# Altium footprint library Connectors_Old.PcbLib: 246 footprints (part 4 of 18)
Each footprint in its own frame and in the unit in brackets; x right, y up, seen from the top. Pads: shape width x height; smd on the part's side, far side on the other; paste and mask are expansions set on the pad; w line width, h text height; cw(c..) or ccw(c..) is an arc to the next point about the centre after c.
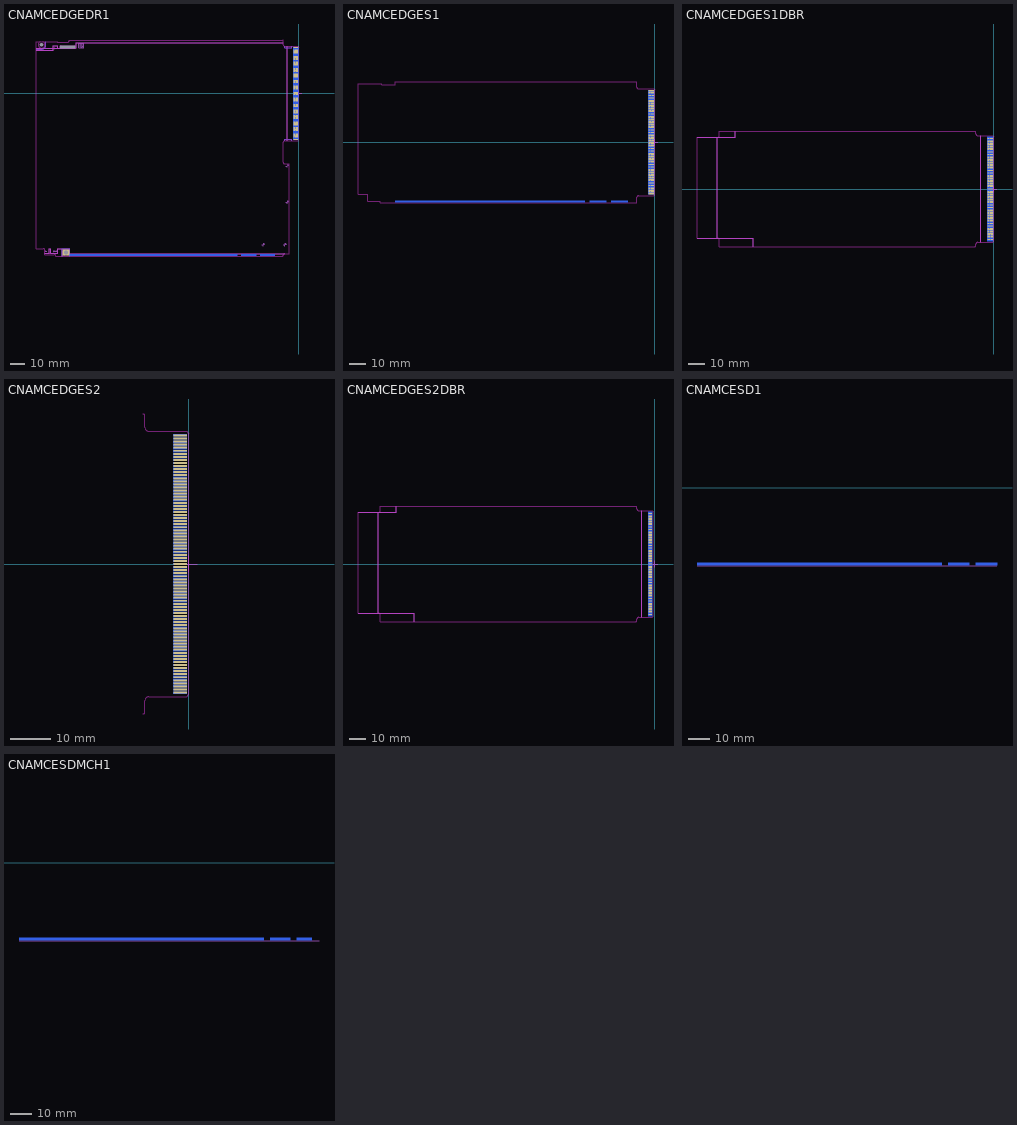
[diagram p3: the footprints below, top view; thin cyan lines are the x and y axes]

## CNAMCEDGEDR1 [mm] "AMC double edge connector standard for RTM"
pads (286):
  rect 2.2x0.48 smd paste-3: 0(-1.6,-30) 0(-1.6,30)
  rect 1.9x0.48 smd far side paste-3 mask-3: 0(-1.45,-30.75) 0(-1.45,-30) 0(-1.45,-28.5) 0(-1.45,-27.75) 0(-1.45,-26.25) 0(-1.45,-25.5) 0(-1.45,-24) 0(-1.45,-23.25) 0(-1.45,-21.75) 0(-1.45,-21) 0(-1.45,-19.5) 0(-1.45,-18.75) 0(-1.45,-17.25) 0(-1.45,-16.5) 0(-1.45,-15) 0(-1.45,-14.25) 0(-1.45,-12.75) 0(-1.45,-12) 0(-1.45,-10.5) 0(-1.45,-9.75) 0(-1.45,-8.25) 0(-1.45,-7.5) 0(-1.45,-6) 0(-1.45,-5.25) 0(-1.45,-3.75) 0(-1.45,-3) 0(-1.45,-1.5) 0(-1.45,-0.75) 0(-1.45,0.75) 0(-1.45,1.5) 0(-1.45,3) 0(-1.45,3.75) 0(-1.45,5.25) 0(-1.45,6) 0(-1.45,7.5) 0(-1.45,8.25) 0(-1.45,9.75) 0(-1.45,10.5) 0(-1.45,12) 0(-1.45,12.75) 0(-1.45,14.25) 0(-1.45,15) 0(-1.45,16.5) 0(-1.45,17.25) 0(-1.45,18.75) 0(-1.45,19.5) 0(-1.45,21) 0(-1.45,21.75) 0(-1.45,23.25) 0(-1.45,24) 0(-1.45,25.5) 0(-1.45,26.25)
  rect 1.9x0.48 smd paste-3: 0(-1.45,-28.5) 0(-1.45,-27.75) 0(-1.45,-26.25) 0(-1.45,-25.5) 0(-1.45,-24) 0(-1.45,-23.25) 0(-1.45,-19.5) 0(-1.45,-18.75) 0(-1.45,-17.25) 0(-1.45,-16.5) 0(-1.45,-15) 0(-1.45,-14.25) 0(-1.45,-12.75) 0(-1.45,-12) 0(-1.45,-8.25) 0(-1.45,-7.5) 0(-1.45,-6) 0(-1.45,-5.25) 0(-1.45,-3.75) 0(-1.45,-3) 0(-1.45,-1.5) 0(-1.45,-0.75) 0(-1.45,3) 0(-1.45,3.75) 0(-1.45,5.25) 0(-1.45,6) 0(-1.45,7.5) 0(-1.45,8.25) 0(-1.45,9.75) 0(-1.45,10.5) 0(-1.45,14.25) 0(-1.45,15) 0(-1.45,16.5) 0(-1.45,17.25) 0(-1.45,21) 0(-1.45,21.75) 0(-1.45,23.25) 0(-1.45,24)
  rect 1.15x0.48 smd paste-3: 0(-1.075,-21) 0(-1.075,-9.75) 0(-1.075,1.5) 0(-1.075,12.75) 0(-1.075,19.5) 0(-1.075,26.25) 0(-1.075,27.75) 0(-1.075,28.5)
  rect 1.15x0.48 smd far side paste-3 mask-3: 0(-1.075,27.75) 0(-1.075,28.5) 0(-1.075,29.25) 0(-1.075,30) 0(-1.075,30.75)
  oval 11x2 on Top Solder: 1(-159,31.95)
  rect 3.3x0.48 smd paste-3: 1(-2.15,31.5) 2(-2.15,30.75) 4(-2.15,29.25) 7(-2.15,27) 9(-2.15,25.5) 10(-2.15,24.75) 13(-2.15,22.5) 16(-2.15,20.25) 18(-2.15,18.75) 19(-2.15,18) 22(-2.15,15.75) 25(-2.15,13.5) 27(-2.15,12) 28(-2.15,11.25) 31(-2.15,9) 34(-2.15,6.75) 37(-2.15,4.5) 40(-2.15,2.25) 42(-2.15,0.75) 43(-2.15,0) 46(-2.15,-2.25) 49(-2.15,-4.5) 52(-2.15,-6.75) 55(-2.15,-9) 57(-2.15,-10.5) 58(-2.15,-11.25) 61(-2.15,-13.5) 64(-2.15,-15.75) 67(-2.15,-18) 70(-2.15,-20.25) 72(-2.15,-21.75) 73(-2.15,-22.5) 76(-2.15,-24.75) 79(-2.15,-27) 82(-2.15,-29.25) 84(-2.15,-30.75) 85(-2.15,-31.5)
  oval 11x2 on Bottom Solder: 2(-159,31.95)
  rect 0.9x0.48 smd paste-3: 3(-3.35,30) 83(-3.35,-30)
  rect 1.95x0.48 smd paste-3: 5(-2.825,28.5) 6(-2.825,27.75) 8(-2.825,26.25) 17(-2.825,19.5) 26(-2.825,12.75) 41(-2.825,1.5) 56(-2.825,-9.75) 71(-2.825,-21)
  rect 1.2x0.48 smd paste-3: 11(-3.2,24) 12(-3.2,23.25) 14(-3.2,21.75) 15(-3.2,21) 20(-3.2,17.25) 21(-3.2,16.5) 23(-3.2,15) 24(-3.2,14.25) 29(-3.2,10.5) 30(-3.2,9.75) 32(-3.2,8.25) 33(-3.2,7.5) 35(-3.2,6) 36(-3.2,5.25) 38(-3.2,3.75) 39(-3.2,3) 44(-3.2,-0.75) 45(-3.2,-1.5) 47(-3.2,-3) 48(-3.2,-3.75) 50(-3.2,-5.25) 51(-3.2,-6) 53(-3.2,-7.5) 54(-3.2,-8.25) 59(-3.2,-12) 60(-3.2,-12.75) 62(-3.2,-14.25) 63(-3.2,-15) 65(-3.2,-16.5) 66(-3.2,-17.25) 68(-3.2,-18.75) 69(-3.2,-19.5) 74(-3.2,-23.25) 75(-3.2,-24) 77(-3.2,-25.5) 78(-3.2,-26.25) 80(-3.2,-27.75) 81(-3.2,-28.5)
  rect 3.3x0.48 smd far side paste-3 mask-3: 86(-2.15,-31.5) 89(-2.15,-29.25) 92(-2.15,-27) 95(-2.15,-24.75) 98(-2.15,-22.5) 101(-2.15,-20.25) 104(-2.15,-18) 107(-2.15,-15.75) 110(-2.15,-13.5) 113(-2.15,-11.25) 116(-2.15,-9) 119(-2.15,-6.75) 122(-2.15,-4.5) 125(-2.15,-2.25) 128(-2.15,0) 131(-2.15,2.25) 134(-2.15,4.5) 137(-2.15,6.75) 140(-2.15,9) 143(-2.15,11.25) 146(-2.15,13.5) 149(-2.15,15.75) 152(-2.15,18) 155(-2.15,20.25) 158(-2.15,22.5) 161(-2.15,24.75) 164(-2.15,27) 170(-2.15,31.5)
  rect 1.2x0.48 smd far side paste-3 mask-3: 87(-3.2,-30.75) 88(-3.2,-30) 90(-3.2,-28.5) 91(-3.2,-27.75) 93(-3.2,-26.25) 94(-3.2,-25.5) 96(-3.2,-24) 97(-3.2,-23.25) 99(-3.2,-21.75) 100(-3.2,-21) 102(-3.2,-19.5) 103(-3.2,-18.75) 105(-3.2,-17.25) 106(-3.2,-16.5) 108(-3.2,-15) 109(-3.2,-14.25) 111(-3.2,-12.75) 112(-3.2,-12) 114(-3.2,-10.5) 115(-3.2,-9.75) 117(-3.2,-8.25) 118(-3.2,-7.5) 120(-3.2,-6) 121(-3.2,-5.25) 123(-3.2,-3.75) 124(-3.2,-3) 126(-3.2,-1.5) 127(-3.2,-0.75) 129(-3.2,0.75) 130(-3.2,1.5) 132(-3.2,3) 133(-3.2,3.75) 135(-3.2,5.25) 136(-3.2,6) 138(-3.2,7.5) 139(-3.2,8.25) 141(-3.2,9.75) 142(-3.2,10.5) 144(-3.2,12) 145(-3.2,12.75) 147(-3.2,14.25) 148(-3.2,15) 150(-3.2,16.5) 151(-3.2,17.25) 153(-3.2,18.75) 154(-3.2,19.5) 156(-3.2,21) 157(-3.2,21.75) 159(-3.2,23.25) 160(-3.2,24) 162(-3.2,25.5) 163(-3.2,26.25)
  rect 1.95x0.48 smd far side paste-3 mask-3: 165(-2.825,27.75) 166(-2.825,28.5) 167(-2.825,29.25) 168(-2.825,30) 169(-2.825,30.75)
  rect 10x1 smd far side paste-3 mask-3: EP1(-21.5,-110.95) EP1(-21.5,-110.95) EP2(-34.5,-110.95) EP2(-34.5,-110.95)
  rect 4.7x4.4 / inner round 0 / far side rect 4.7x4.4 hole 2.7 copper offset 0,0.15 paste-2.54 mask+0.254: EP3(-160,-109.4)
  rect 115.5x1 smd far side paste-3 mask-3: EP3(-100.25,-110.95) EP3(-100.25,-110.95)
  round 0 hole 2.7 unplated paste-2.54 mask+1.8: MH2(-176.85,33.5)
  round 0 hole 1.6 slot 10.6 at 0 deg unplated: MH3(-159,31.95)
Top Layer keep-out:
  lines w0.1: -180.6,30.85 -175.665,30.85 ; -174.6,-109.9 -165.8,-109.9 -165.8,-106.8 -157.4,-106.8 -157.4,-111.75 ; -173.95,33.501 -173.95,35.65 ; -9.8,-32.5 -9.8,-31.3 -5,-31.3 -5,-32.5 ; -9.8,32.5 -9.8,31.3 -5,31.3 -5,32.5
  lines w0.102: -175.665,30.851 ccw(c-176.86,33.501) -173.953,33.494
Bottom Layer keep-out:
  lines w0.1: -162.625,-111.75 -162.625,-106.8 -157.4,-106.8 -157.4,-111.75 ; -9.8,-32.5 -9.8,-31.3 -5,-31.3 -5,-32.5 ; -9.8,32.5 -9.8,31.3 -5,31.3 -5,32.5
  lines w0.102: -180.6,30.5 -176.85,30.5 ccw(c-176.85,33.5) -173.85,33.493 -173.85,35.65
Top Solder:
  rectangle: -158,35.1 -10.6,36.9
  rectangle: -157.475,-111.9 -9.8,-110.1
  rectangle: -3.9,-32.75 0.25,32.75
Bottom Solder:
  rectangle: -157.475,-111.9 -9.8,-110.1
  rectangle: -3.9,-32.75 0.25,32.75
  rectangle: -158,35.1 -10.6,36.9
Keep-Out Layer:
  lines w0.1: -168,-110.75 -174.6,-110.75 -174.6,-107.55 ccw(c-175.6,-107.55) -175.6,-106.55 -180.6,-106.55 -180.6,35.65 -166.25,35.65 ccw(c-165.384,36.15) -165.384,35.15 -159,35.15 ccw(c-159,36.15) -158,36.15 -158,36.75 -11.3,36.75 cw(c-11.3,36.25) -10.8,36.25 -10.8,33.5 ccw(c-9.8,33.5) -9.8,32.5 -0.6,32.5 0,31.9 0,-31.9 -0.6,-32.5 -9.8,-32.5 ccw(c-9.8,-33.5) -10.8,-33.5 -10.8,-47.35 ccw(c-9.8,-47.35) -9.8,-48.35 -6.7,-48.35 -6.7,-110 -9.8,-110 ccw(c-9.8,-111) -10.8,-111 -10.8,-111.25 cw(c-11.3,-111.25) -11.3,-111.75 -167,-111.75
Keep-Out Layer:
  circle w0.1: c-160,-109.4 r2.3
  lines w0.1: -177.674,35.647 ccw(c-176.85,33.5) -176.026,35.647 ; -168,-110.75 cw(c-168,-111.75) -167,-111.75 ; -163.5,30.95 cw(c-163.5,31.95) -163.5,32.95 -154,32.95 cw(c-154,31.95) -154,30.95 -163.5,30.95
Mechanical 13 keep-out:
  lines w0.1: -180.6,30.95 -153.6,30.95 -153,31.55 -153,35 -10.8,35 ; -174.6,-109.9 -171.7,-109.9 -171.7,-106.8 -170.4,-106.8 -170.4,-109.9 -165.8,-109.9 -165.8,-106.8 -157.4,-106.8 -157.4,-110 -9.8,-110 ; -7.9,-32.475 -7.9,32.525
Mechanical 14 keep-out:
  lines w0.1: -168.8,29.8 -168.8,32.975 -165.65,32.975 -165.65,30.95 -153.6,30.95 -153,31.55 -153,35 -10.8,35 ; -162.6,-111.75 -162.6,-106.8 -157.4,-106.8 -157.4,-110 -9.8,-110 ; -7.9,-32.5 -7.9,32.5
  lines w0.102: -180.6,29.8 -168.8,29.8
Mechanical 15:
  lines w0.1: -174.25,-108.325 -173.45,-108.325 -173.85,-107.925 -173.85,-108.725 ; -168.6,-107.95 -168.6,-108.75 -169,-108.35 -166.5,-108.35 -166.9,-107.95 -166.9,-108.75 ; -168.167,31 -167.367,31 -167.767,30.6 -167.767,31.4 ; -167.75,-108.75 -167.75,-107.95 ; -151.35,32.7 -147.85,32.7 -149.6,31.3 -149.6,34.1 ; -25.7,-104 -24.7,-104 -24.7,-105 ; -10.7,-104 -9.7,-104 -9.7,-105 ; -9.2,-74.85 -8.2,-74.85 -8.2,-75.85 ; -9.2,-49.85 -8.2,-49.85 -8.2,-50.85 ; -23.7,-103.6 -24.3,-103.6 -24.3,-103 -23.7,-103.6 ; -23.7,-103.6 -23.7,-103.6 ; -8.7,-103.6 -9.3,-103.6 -9.3,-103 -8.7,-103.6 ; -8.7,-103.6 -8.7,-103.6 ; -7.2,-74.45 -7.8,-73.85 -7.8,-74.45 -7.2,-74.45 ; -7.2,-74.45 -7.2,-74.45 ; -7.2,-49.45 -7.8,-49.45 -7.8,-48.85 -7.2,-49.45 ; -7.2,-49.45 -7.2,-49.45 ; -151.35,31.3 -147.85,31.3 -147.85,34.1 -151.35,34.1 -151.35,31.3
  lines w0.15: -2,0 2,0 ; 0,-2 0,2

## CNAMCEDGES1 [mm] "AMC single edge connector standard"
pads (278):
  rect 2.2x0.48 smd paste-3: 0(-1.6,-30) 0(-1.6,30)
  rect 1.9x0.48 smd far side paste-3 mask-3: 0(-1.45,-30.75) 0(-1.45,-30) 0(-1.45,-28.5) 0(-1.45,-27.75) 0(-1.45,-26.25) 0(-1.45,-25.5) 0(-1.45,-24) 0(-1.45,-23.25) 0(-1.45,-21.75) 0(-1.45,-21) 0(-1.45,-19.5) 0(-1.45,-18.75) 0(-1.45,-17.25) 0(-1.45,-16.5) 0(-1.45,-15) 0(-1.45,-14.25) 0(-1.45,-12.75) 0(-1.45,-12) 0(-1.45,-10.5) 0(-1.45,-9.75) 0(-1.45,-8.25) 0(-1.45,-7.5) 0(-1.45,-6) 0(-1.45,-5.25) 0(-1.45,-3.75) 0(-1.45,-3) 0(-1.45,-1.5) 0(-1.45,-0.75) 0(-1.45,0.75) 0(-1.45,1.5) 0(-1.45,3) 0(-1.45,3.75) 0(-1.45,5.25) 0(-1.45,6) 0(-1.45,7.5) 0(-1.45,8.25) 0(-1.45,9.75) 0(-1.45,10.5) 0(-1.45,12) 0(-1.45,12.75) 0(-1.45,14.25) 0(-1.45,15) 0(-1.45,16.5) 0(-1.45,17.25) 0(-1.45,18.75) 0(-1.45,19.5) 0(-1.45,21) 0(-1.45,21.75) 0(-1.45,23.25) 0(-1.45,24) 0(-1.45,25.5) 0(-1.45,26.25)
  rect 1.9x0.48 smd paste-3: 0(-1.45,-28.5) 0(-1.45,-27.75) 0(-1.45,-26.25) 0(-1.45,-25.5) 0(-1.45,-24) 0(-1.45,-23.25) 0(-1.45,-19.5) 0(-1.45,-18.75) 0(-1.45,-17.25) 0(-1.45,-16.5) 0(-1.45,-15) 0(-1.45,-14.25) 0(-1.45,-12.75) 0(-1.45,-12) 0(-1.45,-8.25) 0(-1.45,-7.5) 0(-1.45,-6) 0(-1.45,-5.25) 0(-1.45,-3.75) 0(-1.45,-3) 0(-1.45,-1.5) 0(-1.45,-0.75) 0(-1.45,3) 0(-1.45,3.75) 0(-1.45,5.25) 0(-1.45,6) 0(-1.45,7.5) 0(-1.45,8.25) 0(-1.45,9.75) 0(-1.45,10.5) 0(-1.45,14.25) 0(-1.45,15) 0(-1.45,16.5) 0(-1.45,17.25) 0(-1.45,21) 0(-1.45,21.75) 0(-1.45,23.25) 0(-1.45,24)
  rect 1.15x0.48 smd paste-3: 0(-1.075,-21) 0(-1.075,-9.75) 0(-1.075,1.5) 0(-1.075,12.75) 0(-1.075,19.5) 0(-1.075,26.25) 0(-1.075,27.75) 0(-1.075,28.5)
  rect 1.15x0.48 smd far side paste-3 mask-3: 0(-1.075,27.75) 0(-1.075,28.5) 0(-1.075,29.25) 0(-1.075,30) 0(-1.075,30.75)
  rect 3.3x0.48 smd paste-3: 1(-2.15,31.5) 2(-2.15,30.75) 4(-2.15,29.25) 7(-2.15,27) 9(-2.15,25.5) 10(-2.15,24.75) 13(-2.15,22.5) 16(-2.15,20.25) 18(-2.15,18.75) 19(-2.15,18) 22(-2.15,15.75) 25(-2.15,13.5) 27(-2.15,12) 28(-2.15,11.25) 31(-2.15,9) 34(-2.15,6.75) 37(-2.15,4.5) 40(-2.15,2.25) 42(-2.15,0.75) 43(-2.15,0) 46(-2.15,-2.25) 49(-2.15,-4.5) 52(-2.15,-6.75) 55(-2.15,-9) 57(-2.15,-10.5) 58(-2.15,-11.25) 61(-2.15,-13.5) 64(-2.15,-15.75) 67(-2.15,-18) 70(-2.15,-20.25) 72(-2.15,-21.75) 73(-2.15,-22.5) 76(-2.15,-24.75) 79(-2.15,-27) 82(-2.15,-29.25) 84(-2.15,-30.75) 85(-2.15,-31.5)
  rect 0.9x0.48 smd paste-3: 3(-3.35,30) 83(-3.35,-30)
  rect 1.95x0.48 smd paste-3: 5(-2.825,28.5) 6(-2.825,27.75) 8(-2.825,26.25) 17(-2.825,19.5) 26(-2.825,12.75) 41(-2.825,1.5) 56(-2.825,-9.75) 71(-2.825,-21)
  rect 1.2x0.48 smd paste-3: 11(-3.2,24) 12(-3.2,23.25) 14(-3.2,21.75) 15(-3.2,21) 20(-3.2,17.25) 21(-3.2,16.5) 23(-3.2,15) 24(-3.2,14.25) 29(-3.2,10.5) 30(-3.2,9.75) 32(-3.2,8.25) 33(-3.2,7.5) 35(-3.2,6) 36(-3.2,5.25) 38(-3.2,3.75) 39(-3.2,3) 44(-3.2,-0.75) 45(-3.2,-1.5) 47(-3.2,-3) 48(-3.2,-3.75) 50(-3.2,-5.25) 51(-3.2,-6) 53(-3.2,-7.5) 54(-3.2,-8.25) 59(-3.2,-12) 60(-3.2,-12.75) 62(-3.2,-14.25) 63(-3.2,-15) 65(-3.2,-16.5) 66(-3.2,-17.25) 68(-3.2,-18.75) 69(-3.2,-19.5) 74(-3.2,-23.25) 75(-3.2,-24) 77(-3.2,-25.5) 78(-3.2,-26.25) 80(-3.2,-27.75) 81(-3.2,-28.5)
  rect 3.3x0.48 smd far side paste-3 mask-3: 86(-2.15,-31.5) 89(-2.15,-29.25) 92(-2.15,-27) 95(-2.15,-24.75) 98(-2.15,-22.5) 101(-2.15,-20.25) 104(-2.15,-18) 107(-2.15,-15.75) 110(-2.15,-13.5) 113(-2.15,-11.25) 116(-2.15,-9) 119(-2.15,-6.75) 122(-2.15,-4.5) 125(-2.15,-2.25) 128(-2.15,0) 131(-2.15,2.25) 134(-2.15,4.5) 137(-2.15,6.75) 140(-2.15,9) 143(-2.15,11.25) 146(-2.15,13.5) 149(-2.15,15.75) 152(-2.15,18) 155(-2.15,20.25) 158(-2.15,22.5) 161(-2.15,24.75) 164(-2.15,27) 170(-2.15,31.5)
  rect 1.2x0.48 smd far side paste-3 mask-3: 87(-3.2,-30.75) 88(-3.2,-30) 90(-3.2,-28.5) 91(-3.2,-27.75) 93(-3.2,-26.25) 94(-3.2,-25.5) 96(-3.2,-24) 97(-3.2,-23.25) 99(-3.2,-21.75) 100(-3.2,-21) 102(-3.2,-19.5) 103(-3.2,-18.75) 105(-3.2,-17.25) 106(-3.2,-16.5) 108(-3.2,-15) 109(-3.2,-14.25) 111(-3.2,-12.75) 112(-3.2,-12) 114(-3.2,-10.5) 115(-3.2,-9.75) 117(-3.2,-8.25) 118(-3.2,-7.5) 120(-3.2,-6) 121(-3.2,-5.25) 123(-3.2,-3.75) 124(-3.2,-3) 126(-3.2,-1.5) 127(-3.2,-0.75) 129(-3.2,0.75) 130(-3.2,1.5) 132(-3.2,3) 133(-3.2,3.75) 135(-3.2,5.25) 136(-3.2,6) 138(-3.2,7.5) 139(-3.2,8.25) 141(-3.2,9.75) 142(-3.2,10.5) 144(-3.2,12) 145(-3.2,12.75) 147(-3.2,14.25) 148(-3.2,15) 150(-3.2,16.5) 151(-3.2,17.25) 153(-3.2,18.75) 154(-3.2,19.5) 156(-3.2,21) 157(-3.2,21.75) 159(-3.2,23.25) 160(-3.2,24) 162(-3.2,25.5) 163(-3.2,26.25)
  rect 1.95x0.48 smd far side paste-3 mask-3: 165(-2.825,27.75) 166(-2.825,28.5) 167(-2.825,29.25) 168(-2.825,30) 169(-2.825,30.75)
  rect 10x1 smd far side paste-3 mask-3: EP1(-21.5,-35.95) EP2(-34.5,-35.95)
  rect 115.5x1 smd far side paste-3 mask-3: EP3(-100.25,-35.95)
Top Solder:
  rectangle: -158,35.1 -10.6,36.9
  rectangle: -157.475,-36.9 -10.6,-35.1
  rectangle: -3.9,-32.75 0.25,32.75
Bottom Solder:
  rectangle: -157.475,-36.9 -10.6,-35.1
  rectangle: -3.9,-32.75 0.25,32.75
  rectangle: -158,35.1 -10.6,36.9
Keep-Out Layer:
  lines w0.1: -180.6,-31.55 -180.6,35.65 -166.25,35.65 -166.25,35.15 -158,35.15 -158,36.75 -11.3,36.75 cw(c-11.3,36.25) -10.8,36.25 -10.8,33.5 ccw(c-9.8,33.5) -9.8,32.5 -0.6,32.5 0,31.9 0,-31.9 -0.6,-32.5 -9.8,-32.5 ccw(c-9.8,-33.5) -10.8,-33.5 -10.8,-36.25 cw(c-11.3,-36.25) -11.3,-36.75 -167,-36.75 -167,-35.75 -174.6,-35.75 -174.6,-31.55 -180.6,-31.55
Mechanical 15:
  lines w0.15: -2,0 2,0 ; 0,-2 0,2
3D body: height 0, standoff 0, extent -9.8,-32.5 -5,-31.3
3D body: height 0, standoff 0, extent -9.8,31.3 -5,32.5

## CNAMCEDGES1DBR [mm] "AMC daughter board reversed single edge connector standard"
pads (275):
  rect 2.2x0.48 smd far side paste-3: 0(-1.6,-30) 0(-1.6,30)
  rect 1.9x0.48 smd paste-3 mask-3: 0(-1.45,-26.25) 0(-1.45,-25.5) 0(-1.45,-24) 0(-1.45,-23.25) 0(-1.45,-21.75) 0(-1.45,-21) 0(-1.45,-19.5) 0(-1.45,-18.75) 0(-1.45,-17.25) 0(-1.45,-16.5) 0(-1.45,-15) 0(-1.45,-14.25) 0(-1.45,-12.75) 0(-1.45,-12) 0(-1.45,-10.5) 0(-1.45,-9.75) 0(-1.45,-8.25) 0(-1.45,-7.5) 0(-1.45,-6) 0(-1.45,-5.25) 0(-1.45,-3.75) 0(-1.45,-3) 0(-1.45,-1.5) 0(-1.45,-0.75) 0(-1.45,0.75) 0(-1.45,1.5) 0(-1.45,3) 0(-1.45,3.75) 0(-1.45,5.25) 0(-1.45,6) 0(-1.45,7.5) 0(-1.45,8.25) 0(-1.45,9.75) 0(-1.45,10.5) 0(-1.45,12) 0(-1.45,12.75) 0(-1.45,14.25) 0(-1.45,15) 0(-1.45,16.5) 0(-1.45,17.25) 0(-1.45,18.75) 0(-1.45,19.5) 0(-1.45,21) 0(-1.45,21.75) 0(-1.45,23.25) 0(-1.45,24) 0(-1.45,25.5) 0(-1.45,26.25) 0(-1.45,27.75) 0(-1.45,28.5) 0(-1.45,30) 0(-1.45,30.75)
  rect 1.9x0.48 smd far side paste-3: 0(-1.45,-24) 0(-1.45,-23.25) 0(-1.45,-21.75) 0(-1.45,-21) 0(-1.45,-17.25) 0(-1.45,-16.5) 0(-1.45,-15) 0(-1.45,-14.25) 0(-1.45,-10.5) 0(-1.45,-9.75) 0(-1.45,-8.25) 0(-1.45,-7.5) 0(-1.45,-6) 0(-1.45,-5.25) 0(-1.45,-3.75) 0(-1.45,-3) 0(-1.45,0.75) 0(-1.45,1.5) 0(-1.45,3) 0(-1.45,3.75) 0(-1.45,5.25) 0(-1.45,6) 0(-1.45,7.5) 0(-1.45,8.25) 0(-1.45,12) 0(-1.45,12.75) 0(-1.45,14.25) 0(-1.45,15) 0(-1.45,16.5) 0(-1.45,17.25) 0(-1.45,18.75) 0(-1.45,19.5) 0(-1.45,23.25) 0(-1.45,24) 0(-1.45,25.5) 0(-1.45,26.25) 0(-1.45,27.75) 0(-1.45,28.5)
  rect 1.15x0.48 smd paste-3 mask-3: 0(-1.075,-30.75) 0(-1.075,-30) 0(-1.075,-29.25) 0(-1.075,-28.5) 0(-1.075,-27.75)
  rect 1.15x0.48 smd far side paste-3: 0(-1.075,-28.5) 0(-1.075,-27.75) 0(-1.075,-26.25) 0(-1.075,-19.5) 0(-1.075,-12.75) 0(-1.075,-1.5) 0(-1.075,9.75) 0(-1.075,21)
  rect 3.3x0.48 smd far side paste-3: 1(-2.15,-31.5) 2(-2.15,-30.75) 4(-2.15,-29.25) 7(-2.15,-27) 9(-2.15,-25.5) 10(-2.15,-24.75) 13(-2.15,-22.5) 16(-2.15,-20.25) 18(-2.15,-18.75) 19(-2.15,-18) 22(-2.15,-15.75) 25(-2.15,-13.5) 27(-2.15,-12) 28(-2.15,-11.25) 31(-2.15,-9) 34(-2.15,-6.75) 37(-2.15,-4.5) 40(-2.15,-2.25) 42(-2.15,-0.75) 43(-2.15,0) 46(-2.15,2.25) 49(-2.15,4.5) 52(-2.15,6.75) 55(-2.15,9) 57(-2.15,10.5) 58(-2.15,11.25) 61(-2.15,13.5) 64(-2.15,15.75) 67(-2.15,18) 70(-2.15,20.25) 72(-2.15,21.75) 73(-2.15,22.5) 76(-2.15,24.75) 79(-2.15,27) 82(-2.15,29.25) 84(-2.15,30.75) 85(-2.15,31.5)
  rect 0.9x0.48 smd far side paste-3: 3(-3.35,-30) 83(-3.35,30)
  rect 1.95x0.48 smd far side paste-3: 5(-2.825,-28.5) 6(-2.825,-27.75) 8(-2.825,-26.25) 17(-2.825,-19.5) 26(-2.825,-12.75) 41(-2.825,-1.5) 56(-2.825,9.75) 71(-2.825,21)
  rect 1.2x0.48 smd far side paste-3: 11(-3.2,-24) 12(-3.2,-23.25) 14(-3.2,-21.75) 15(-3.2,-21) 20(-3.2,-17.25) 21(-3.2,-16.5) 23(-3.2,-15) 24(-3.2,-14.25) 29(-3.2,-10.5) 30(-3.2,-9.75) 32(-3.2,-8.25) 33(-3.2,-7.5) 35(-3.2,-6) 36(-3.2,-5.25) 38(-3.2,-3.75) 39(-3.2,-3) 44(-3.2,0.75) 45(-3.2,1.5) 47(-3.2,3) 48(-3.2,3.75) 50(-3.2,5.25) 51(-3.2,6) 53(-3.2,7.5) 54(-3.2,8.25) 59(-3.2,12) 60(-3.2,12.75) 62(-3.2,14.25) 63(-3.2,15) 65(-3.2,16.5) 66(-3.2,17.25) 68(-3.2,18.75) 69(-3.2,19.5) 74(-3.2,23.25) 75(-3.2,24) 77(-3.2,25.5) 78(-3.2,26.25) 80(-3.2,27.75) 81(-3.2,28.5)
  rect 3.3x0.48 smd paste-3 mask-3: 86(-2.15,31.5) 89(-2.15,29.25) 92(-2.15,27) 95(-2.15,24.75) 98(-2.15,22.5) 101(-2.15,20.25) 104(-2.15,18) 107(-2.15,15.75) 110(-2.15,13.5) 113(-2.15,11.25) 116(-2.15,9) 119(-2.15,6.75) 122(-2.15,4.5) 125(-2.15,2.25) 128(-2.15,0) 131(-2.15,-2.25) 134(-2.15,-4.5) 137(-2.15,-6.75) 140(-2.15,-9) 143(-2.15,-11.25) 146(-2.15,-13.5) 149(-2.15,-15.75) 152(-2.15,-18) 155(-2.15,-20.25) 158(-2.15,-22.5) 161(-2.15,-24.75) 164(-2.15,-27) 170(-2.15,-31.5)
  rect 1.2x0.48 smd paste-3 mask-3: 87(-3.2,30.75) 88(-3.2,30) 90(-3.2,28.5) 91(-3.2,27.75) 93(-3.2,26.25) 94(-3.2,25.5) 96(-3.2,24) 97(-3.2,23.25) 99(-3.2,21.75) 100(-3.2,21) 102(-3.2,19.5) 103(-3.2,18.75) 105(-3.2,17.25) 106(-3.2,16.5) 108(-3.2,15) 109(-3.2,14.25) 111(-3.2,12.75) 112(-3.2,12) 114(-3.2,10.5) 115(-3.2,9.75) 117(-3.2,8.25) 118(-3.2,7.5) 120(-3.2,6) 121(-3.2,5.25) 123(-3.2,3.75) 124(-3.2,3) 126(-3.2,1.5) 127(-3.2,0.75) 129(-3.2,-0.75) 130(-3.2,-1.5) 132(-3.2,-3) 133(-3.2,-3.75) 135(-3.2,-5.25) 136(-3.2,-6) 138(-3.2,-7.5) 139(-3.2,-8.25) 141(-3.2,-9.75) 142(-3.2,-10.5) 144(-3.2,-12) 145(-3.2,-12.75) 147(-3.2,-14.25) 148(-3.2,-15) 150(-3.2,-16.5) 151(-3.2,-17.25) 153(-3.2,-18.75) 154(-3.2,-19.5) 156(-3.2,-21) 157(-3.2,-21.75) 159(-3.2,-23.25) 160(-3.2,-24) 162(-3.2,-25.5) 163(-3.2,-26.25)
  rect 1.95x0.48 smd paste-3 mask-3: 165(-2.825,-27.75) 166(-2.825,-28.5) 167(-2.825,-29.25) 168(-2.825,-30) 169(-2.825,-30.75)
Top Solder:
  rectangle: -3.9,-32.75 0.25,32.75
Bottom Solder:
  rectangle: -3.9,-32.75 0.25,32.75
Keep-Out Layer:
  lines w0.1: -180.6,-30 -168.1,-30 cw(c-168.1,-31) -167.1,-31 -167.1,-35 -11.3,-35 ccw(c-11.3,-34.5) -10.8,-34.5 -10.8,-33.5 cw(c-9.8,-33.5) -9.8,-32.5 -0.6,-32.5 0,-31.9 0,31.9 -0.6,32.5 -9.8,32.5 cw(c-9.8,33.5) -10.8,33.5 -10.8,34.5 ccw(c-11.3,34.5) -11.3,35 -167.1,35 -167.1,32.5 cw(c-168.1,32.5) -168.1,31.5 -180.6,31.5 -180.6,-30
Mechanical 13 keep-out:
  lines w0.102: -180.6,-30 -146.5,-30 -146.5,-35 ; -180.6,31.5 -157.3,31.5 -157.3,35 ; -7.9,-32.5 -7.9,32.5
Mechanical 14 keep-out:
  lines w0.102: -168.3,-30 -168.3,31.5 ; -7.9,-32.5 -7.9,32.5
Mechanical 15:
  lines w0.15: -2,0 2,0 ; 0,-2 0,2
  text "AMC daughter board REVERSED!" at 2,-20 h1.5
3D body: height 0, standoff 0, extent -9.8,-32.5 -5,-31.3
3D body: height 0, standoff 0, extent -9.8,31.3 -5,32.5

## CNAMCEDGES2 [mm] "AMC single edge connector standard NON SEGMENTED!!!"
pads (170):
  rect 3.3x0.48 smd paste-3: 1(-2.15,31.5) 2(-2.15,30.75) 3(-2.15,30) 4(-2.15,29.25) 5(-2.15,28.5) 6(-2.15,27.75) 7(-2.15,27) 8(-2.15,26.25) 9(-2.15,25.5) 10(-2.15,24.75) 11(-2.15,24) 12(-2.15,23.25) 13(-2.15,22.5) 14(-2.15,21.75) 15(-2.15,21) 16(-2.15,20.25) 17(-2.15,19.5) 18(-2.15,18.75) 19(-2.15,18) 20(-2.15,17.25) 21(-2.15,16.5) 22(-2.15,15.75) 23(-2.15,15) 24(-2.15,14.25) 25(-2.15,13.5) 26(-2.15,12.75) 27(-2.15,12) 28(-2.15,11.25) 29(-2.15,10.5) 30(-2.15,9.75) 31(-2.15,9) 32(-2.15,8.25) 33(-2.15,7.5) 34(-2.15,6.75) 35(-2.15,6) 36(-2.15,5.25) 37(-2.15,4.5) 38(-2.15,3.75) 39(-2.15,3) 40(-2.15,2.25) 41(-2.15,1.5) 42(-2.15,0.75) 43(-2.15,0) 44(-2.15,-0.75) 45(-2.15,-1.5) 46(-2.15,-2.25) 47(-2.15,-3) 48(-2.15,-3.75) 49(-2.15,-4.5) 50(-2.15,-5.25) 51(-2.15,-6) 52(-2.15,-6.75) 53(-2.15,-7.5) 54(-2.15,-8.25) 55(-2.15,-9) 56(-2.15,-9.75) 57(-2.15,-10.5) 58(-2.15,-11.25) 59(-2.15,-12) 60(-2.15,-12.75) 61(-2.15,-13.5) 62(-2.15,-14.25) 63(-2.15,-15) 64(-2.15,-15.75) 65(-2.15,-16.5) 66(-2.15,-17.25) 67(-2.15,-18) 68(-2.15,-18.75) 69(-2.15,-19.5) 70(-2.15,-20.25) 71(-2.15,-21) 72(-2.15,-21.75) 73(-2.15,-22.5) 74(-2.15,-23.25) 75(-2.15,-24) 76(-2.15,-24.75) 77(-2.15,-25.5) 78(-2.15,-26.25) 79(-2.15,-27) 80(-2.15,-27.75) 81(-2.15,-28.5) 82(-2.15,-29.25) 83(-2.15,-30) 84(-2.15,-30.75) 85(-2.15,-31.5)
  rect 3.3x0.48 smd far side paste-3 mask-3: 86(-2.15,-31.5) 87(-2.15,-30.75) 88(-2.15,-30) 89(-2.15,-29.25) 90(-2.15,-28.5) 91(-2.15,-27.75) 92(-2.15,-27) 93(-2.15,-26.25) 94(-2.15,-25.5) 95(-2.15,-24.75) 96(-2.15,-24) 97(-2.15,-23.25) 98(-2.15,-22.5) 99(-2.15,-21.75) 100(-2.15,-21) 101(-2.15,-20.25) 102(-2.15,-19.5) 103(-2.15,-18.75) 104(-2.15,-18) 105(-2.15,-17.25) 106(-2.15,-16.5) 107(-2.15,-15.75) 108(-2.15,-15) 109(-2.15,-14.25) 110(-2.15,-13.5) 111(-2.15,-12.75) 112(-2.15,-12) 113(-2.15,-11.25) 114(-2.15,-10.5) 115(-2.15,-9.75) 116(-2.15,-9) 117(-2.15,-8.25) 118(-2.15,-7.5) 119(-2.15,-6.75) 120(-2.15,-6) 121(-2.15,-5.25) 122(-2.15,-4.5) 123(-2.15,-3.75) 124(-2.15,-3) 125(-2.15,-2.25) 126(-2.15,-1.5) 127(-2.15,-0.75) 128(-2.15,0) 129(-2.15,0.75) 130(-2.15,1.5) 131(-2.15,2.25) 132(-2.15,3) 133(-2.15,3.75) 134(-2.15,4.5) 135(-2.15,5.25) 136(-2.15,6) 137(-2.15,6.75) 138(-2.15,7.5) 139(-2.15,8.25) 140(-2.15,9) 141(-2.15,9.75) 142(-2.15,10.5) 143(-2.15,11.25) 144(-2.15,12) 145(-2.15,12.75) 146(-2.15,13.5) 147(-2.15,14.25) 148(-2.15,15) 149(-2.15,15.75) 150(-2.15,16.5) 151(-2.15,17.25) 152(-2.15,18) 153(-2.15,18.75) 154(-2.15,19.5) 155(-2.15,20.25) 156(-2.15,21) 157(-2.15,21.75) 158(-2.15,22.5) 159(-2.15,23.25) 160(-2.15,24) 161(-2.15,24.75) 162(-2.15,25.5) 163(-2.15,26.25) 164(-2.15,27) 165(-2.15,27.75) 166(-2.15,28.5) 167(-2.15,29.25) 168(-2.15,30) 169(-2.15,30.75) 170(-2.15,31.5)
Top Solder:
  rectangle: -3.9,-32.75 0.25,32.75
Bottom Solder:
  rectangle: -3.9,-32.75 0.25,32.75
Keep-Out Layer:
  lines w0.1: -11.3,-36.75 ccw(c-11.3,-36.25) -10.8,-36.25 -10.8,-33.5 cw(c-9.8,-33.5) -9.8,-32.5 -0.6,-32.5 0,-31.9 0,31.9 -0.6,32.5 -9.8,32.5 cw(c-9.8,33.5) -10.8,33.5 -10.8,36.25 ccw(c-11.3,36.25) -11.3,36.75
Mechanical 15:
  lines w0.15: -2,0 2,0 ; 0,-2 0,2
3D body: height 0, standoff 0, extent -9.8,-32.5 -5,-31.3
3D body: height 0, standoff 0, extent -9.8,31.3 -5,32.5

## CNAMCEDGES2DBR [mm] "AMC daughter board reversed single edge connector 1mm shorter"
pads (170):
  rect 2.3x0.48 smd far side paste-3: 1(-2.65,-31.5) 2(-2.65,-30.75) 3(-2.65,-30) 4(-2.65,-29.25) 5(-2.65,-28.5) 6(-2.65,-27.75) 7(-2.65,-27) 8(-2.65,-26.25) 9(-2.65,-25.5) 10(-2.65,-24.75) 11(-2.65,-24) 12(-2.65,-23.25) 13(-2.65,-22.5) 14(-2.65,-21.75) 15(-2.65,-21) 16(-2.65,-20.25) 17(-2.65,-19.5) 18(-2.65,-18.75) 19(-2.65,-18) 20(-2.65,-17.25) 21(-2.65,-16.5) 22(-2.65,-15.75) 23(-2.65,-15) 24(-2.65,-14.25) 25(-2.65,-13.5) 26(-2.65,-12.75) 27(-2.65,-12) 28(-2.65,-11.25) 29(-2.65,-10.5) 30(-2.65,-9.75) 31(-2.65,-9) 32(-2.65,-8.25) 33(-2.65,-7.5) 34(-2.65,-6.75) 35(-2.65,-6) 36(-2.65,-5.25) 37(-2.65,-4.5) 38(-2.65,-3.75) 39(-2.65,-3) 40(-2.65,-2.25) 41(-2.65,-1.5) 42(-2.65,-0.75) 43(-2.65,0) 44(-2.65,0.75) 45(-2.65,1.5) 46(-2.65,2.25) 47(-2.65,3) 48(-2.65,3.75) 49(-2.65,4.5) 50(-2.65,5.25) 51(-2.65,6) 52(-2.65,6.75) 53(-2.65,7.5) 54(-2.65,8.25) 55(-2.65,9) 56(-2.65,9.75) 57(-2.65,10.5) 58(-2.65,11.25) 59(-2.65,12) 60(-2.65,12.75) 61(-2.65,13.5) 62(-2.65,14.25) 63(-2.65,15) 64(-2.65,15.75) 65(-2.65,16.5) 66(-2.65,17.25) 67(-2.65,18) 68(-2.65,18.75) 69(-2.65,19.5) 70(-2.65,20.25) 71(-2.65,21) 72(-2.65,21.75) 73(-2.65,22.5) 74(-2.65,23.25) 75(-2.65,24) 76(-2.65,24.75) 77(-2.65,25.5) 78(-2.65,26.25) 79(-2.65,27) 80(-2.65,27.75) 81(-2.65,28.5) 82(-2.65,29.25) 83(-2.65,30) 84(-2.65,30.75) 85(-2.65,31.5)
  rect 2.3x0.48 smd paste-3 mask-3: 86(-2.65,31.5) 87(-2.65,30.75) 88(-2.65,30) 89(-2.65,29.25) 90(-2.65,28.5) 91(-2.65,27.75) 92(-2.65,27) 93(-2.65,26.25) 94(-2.65,25.5) 95(-2.65,24.75) 96(-2.65,24) 97(-2.65,23.25) 98(-2.65,22.5) 99(-2.65,21.75) 100(-2.65,21) 101(-2.65,20.25) 102(-2.65,19.5) 103(-2.65,18.75) 104(-2.65,18) 105(-2.65,17.25) 106(-2.65,16.5) 107(-2.65,15.75) 108(-2.65,15) 109(-2.65,14.25) 110(-2.65,13.5) 111(-2.65,12.75) 112(-2.65,12) 113(-2.65,11.25) 114(-2.65,10.5) 115(-2.65,9.75) 116(-2.65,9) 117(-2.65,8.25) 118(-2.65,7.5) 119(-2.65,6.75) 120(-2.65,6) 121(-2.65,5.25) 122(-2.65,4.5) 123(-2.65,3.75) 124(-2.65,3) 125(-2.65,2.25) 126(-2.65,1.5) 127(-2.65,0.75) 128(-2.65,0) 129(-2.65,-0.75) 130(-2.65,-1.5) 131(-2.65,-2.25) 132(-2.65,-3) 133(-2.65,-3.75) 134(-2.65,-4.5) 135(-2.65,-5.25) 136(-2.65,-6) 137(-2.65,-6.75) 138(-2.65,-7.5) 139(-2.65,-8.25) 140(-2.65,-9) 141(-2.65,-9.75) 142(-2.65,-10.5) 143(-2.65,-11.25) 144(-2.65,-12) 145(-2.65,-12.75) 146(-2.65,-13.5) 147(-2.65,-14.25) 148(-2.65,-15) 149(-2.65,-15.75) 150(-2.65,-16.5) 151(-2.65,-17.25) 152(-2.65,-18) 153(-2.65,-18.75) 154(-2.65,-19.5) 155(-2.65,-20.25) 156(-2.65,-21) 157(-2.65,-21.75) 158(-2.65,-22.5) 159(-2.65,-23.25) 160(-2.65,-24) 161(-2.65,-24.75) 162(-2.65,-25.5) 163(-2.65,-26.25) 164(-2.65,-27) 165(-2.65,-27.75) 166(-2.65,-28.5) 167(-2.65,-29.25) 168(-2.65,-30) 169(-2.65,-30.75) 170(-2.65,-31.5)
Top Solder:
  rectangle: -3.9,-32.75 -0.75,32.75
Bottom Solder:
  rectangle: -3.9,-32.75 -0.75,32.75
Keep-Out Layer:
  lines w0.1: -180.6,-30 -168.1,-30 cw(c-168.1,-31) -167.1,-31 -167.1,-35 -11.3,-35 ccw(c-11.3,-34.5) -10.8,-34.5 -10.8,-33.5 cw(c-9.8,-33.5) -9.8,-32.5 -1.6,-32.5 -1,-31.9 -1,31.9 -1.6,32.5 -9.8,32.5 cw(c-9.8,33.5) -10.8,33.5 -10.8,34.5 ccw(c-11.3,34.5) -11.3,35 -167.1,35 -167.1,32.5 cw(c-168.1,32.5) -168.1,31.5 -180.6,31.5 -180.6,-30
Mechanical 13 keep-out:
  lines w0.102: -180.6,-30 -146.5,-30 -146.5,-35 ; -180.6,31.5 -157.3,31.5 -157.3,35 ; -7.9,-32.5 -7.9,32.5
Mechanical 14 keep-out:
  lines w0.102: -168.3,-30 -168.3,31.5 ; -7.9,-32.5 -7.9,32.5
Mechanical 15:
  lines w0.15: -2,0 2,0 ; 0,-2 0,2
  text "AMC daughter board REVERSED!" at 2,-20 h1.5
3D body: height 0, standoff 0, extent -9.8,-32.5 -5,-31.3
3D body: height 0, standoff 0, extent -9.8,31.3 -5,32.5

## CNAMCESD1 [mm] "AMC ESD strip"
pads (3):
  rect 10x1 smd far side paste-3 mask-3: EP1(-21.5,-35.95) EP2(-34.5,-35.95)
  rect 115.5x1 smd far side paste-3 mask-3: EP3(-100.25,-35.95)
Mechanical 15:
  lines w0.1: -158,-36.75 -16.5,-36.75

## CNAMCESDMCH1 [mm] "AMC ESD strip for MCH module"
pads (3):
  rect 7x1 smd far side paste-3 mask-3: EP1(-23.5,-35.95)
  rect 9.5x1 smd far side paste-3 mask-3: EP2(-34.75,-35.95)
  rect 115.5x1 smd far side paste-3 mask-3: EP3(-100.25,-35.95)
Mechanical 15:
  lines w0.1: -158,-36.75 -16.5,-36.75